# Altium footprint library Miscellaneous footprints.PcbLib: 84 footprints (part 4 of 6)
Each footprint in its own frame and in the unit in brackets; x right, y up, seen from the top. Pads: shape width x height; smd on the part's side, far side on the other; paste and mask are expansions set on the pad; w line width, h text height; cw(c..) or ccw(c..) is an arc to the next point about the centre after c.
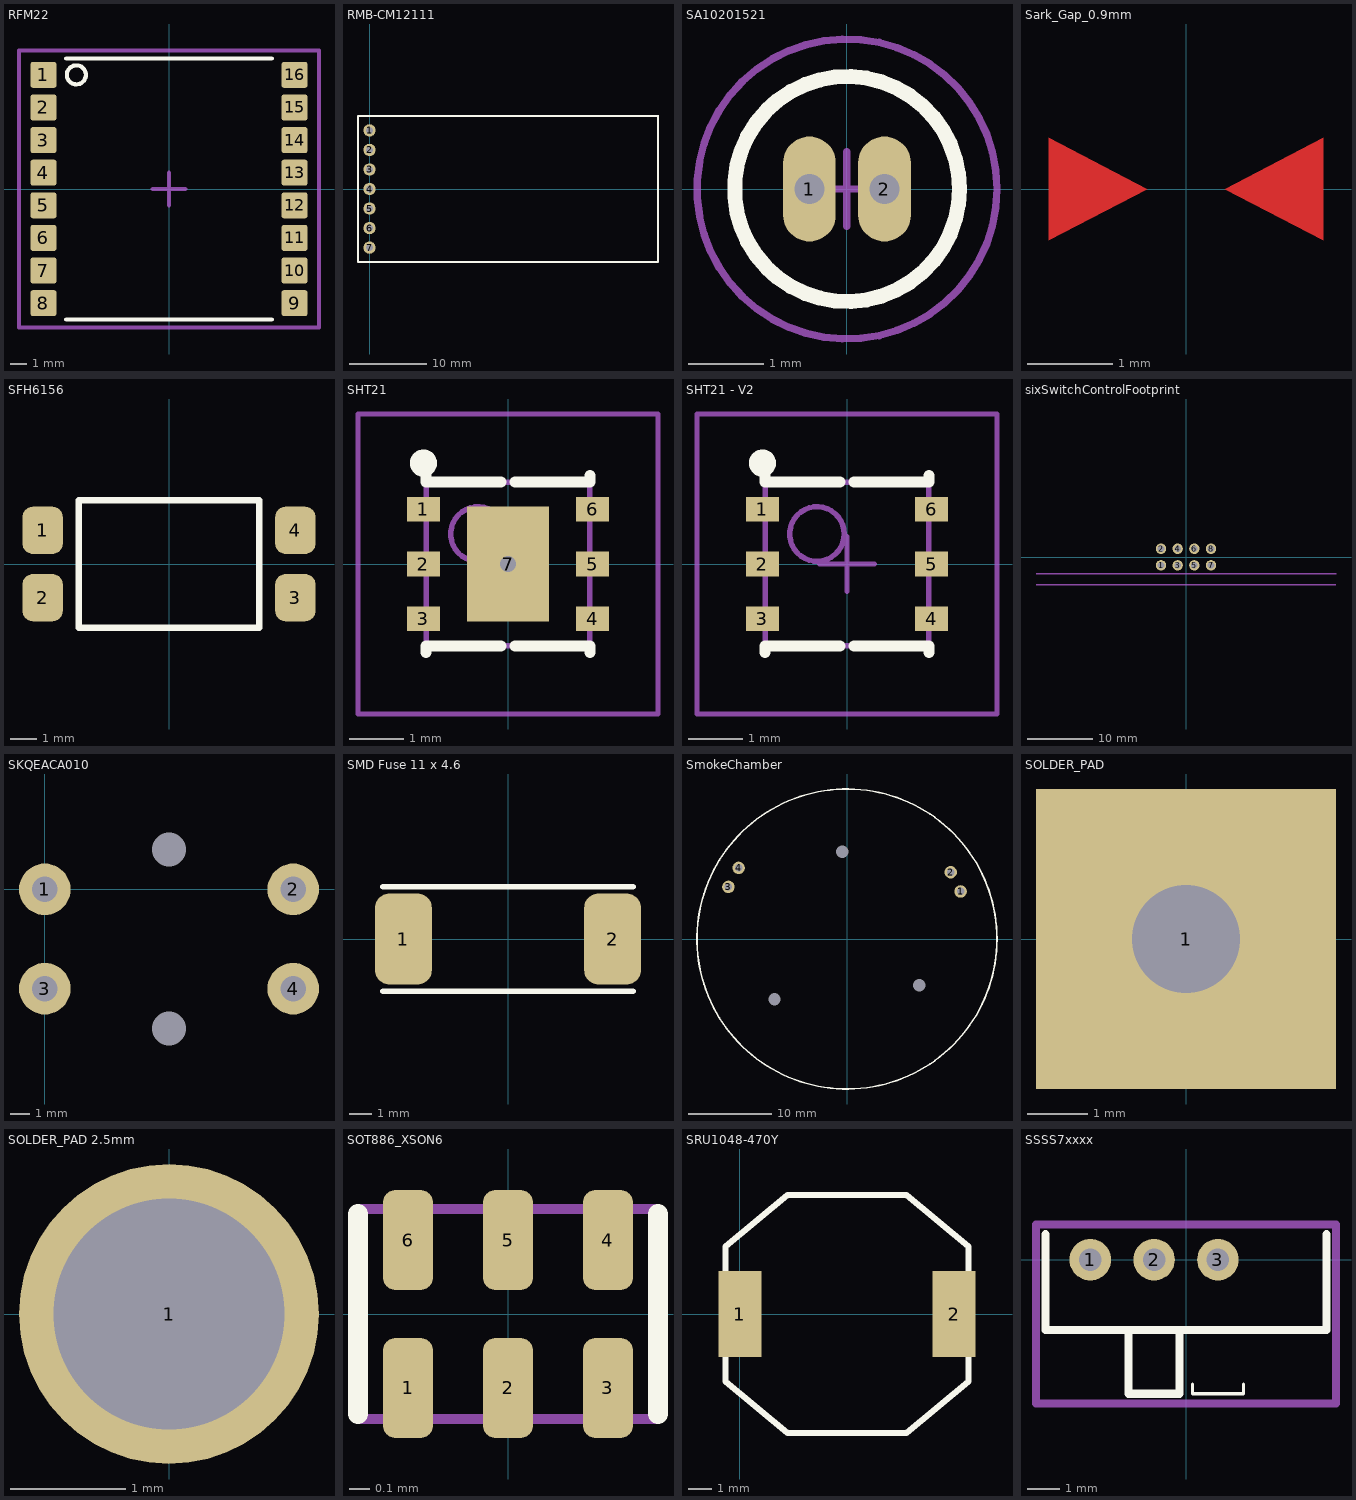
[diagram p3: the footprints below, top view; thin cyan lines are the x and y axes]

## RFM22 [mm] "RFM22"
height 1
pads (16):
  rrect20% 1.6x1.6 smd: 1(-7.7,7) 2(-7.7,5) 3(-7.7,3) 4(-7.7,1) 5(-7.7,-1) 6(-7.7,-3) 7(-7.7,-5) 8(-7.7,-7) 9(7.7,-7) 10(7.7,-5) 11(7.7,-3) 12(7.7,-1) 13(7.7,1) 14(7.7,3) 15(7.7,5) 16(7.7,7)
Top Overlay:
  circle w0.254: c-5.683,7 r0.583
  lines w0.254: -6.3,-8 6.3,-8 ; -6.3,8 6.3,8
Mechanical 15:
  lines w0.254: -1,0 1,0 ; 0,-1 0,1 ; -9.2,-8.5 9.2,-8.5 9.2,8.5 -9.2,8.5 -9.2,-8.5
3D body: height 1.9, standoff 0, extent -8,-8.1 8,7.9

## RMB-CM12111 [mm] "Wireless RF Transceiver 431-470MHz"
height 2.8
pads (7):
  round 1.6 hole 0.9: 1(0,7.62) 2(0,5.08) 3(0,2.54) 4(0,0) 5(0,-2.54) 6(0,-5.08) 7(0,-7.62)
Top Overlay:
  lines w0.254: 37.5,9.5 37.5,-9.5 -1.5,-9.5 -1.5,0 -1.5,9.5 37.5,9.5 ; 37.5,9.5 37.5,9.5

## SA10201521 [mm]
height 6
pads (2):
  oval 0.7x1.4 hole 0.4: 1(-0.5,0) 2(0.5,0)
Top Overlay:
  circle w0.2: c0,0 r1.5
Mechanical 15:
  circle w0.1: c0,0 r2
  lines w0.1: -0.5,0 0.5,0 ; 0,-0.5 0,0.5
3D body: height 6, standoff 0, extent -1.488,-1.497 1.5,1.497

## Sark_Gap_0.9mm [mm] "Sark_Gap_0.7mm"
height 1
Top Layer:
  region: 0.45,0 1.6,0.6 1.6,-0.6
  region: -0.45,0 -1.6,0.6 -1.6,-0.6
Top Solder:
  rectangle: -1.75,-0.75 1.75,0.75

## SFH6156 [mm] "SFH6156"
height 4
pads (4):
  rrect50% 1.52x1.78 smd: 1(-4.765,1.27) 2(-4.765,-1.27) 3(4.765,-1.27) 4(4.765,1.27)
Top Overlay:
  lines w0.254: -3.4,-2.4 -3.4,2.4 3.4,2.4 3.4,-2.4 -3.4,-2.4

## SHT21 [mm] "SHT21"
height 1.1
pads (7):
  rect 0.6x0.45 smd: 1(-1.55,1) 2(-1.55,0) 3(-1.55,-1) 4(1.55,-1) 5(1.55,0) 6(1.55,1)
  rect 1.5x2.1 smd paste-0.8: 7(0,0)
via 0,0 diameter 0.7 hole 0.3
Top Overlay:
  circle w0.25: c-1.55,1.85 r0.125
  lines w0.2: -1.5,-1.625 -1.5,-1.5 -0.125,-1.5 ; -1.5,1.625 -1.5,1.5 -0.125,1.5 ; 0.125,-1.5 1.5,-1.5 1.5,-1.625 ; 0.125,1.5 1.5,1.5 1.5,1.625
Top Paste:
  rectangle: 0.3,-0.6 0.6,-0.2
  rectangle: -0.6,-0.6 -0.3,-0.2
  rectangle: 0.3,0.2 0.6,0.6
  rectangle: -0.6,0.2 -0.3,0.6
Mechanical 13:
  circle w0.1: c-0.55,0.55 r0.5
  lines w0.1: -1.5,-1.5 1.5,-1.5 1.5,1.5 -1.5,1.5 -1.5,-1.5
Mechanical 15:
  lines w0.1: -0.5,0 0.5,0 ; 0,-0.5 0,0.5 ; -2.75,-2.75 2.75,-2.75 2.75,2.75 -2.75,2.75 -2.75,-2.75
3D body: height 1.1, standoff 0, extent -1.53,-1.5 1.53,1.5

## SHT21 - V2 [mm] "SHT21"
height 1.1
pads (6):
  rect 0.6x0.45 smd: 1(-1.55,1) 2(-1.55,0) 3(-1.55,-1) 4(1.55,-1) 5(1.55,0) 6(1.55,1)
Top Overlay:
  circle w0.25: c-1.55,1.85 r0.125
  lines w0.2: -1.5,-1.625 -1.5,-1.5 -0.125,-1.5 ; -1.5,1.625 -1.5,1.5 -0.125,1.5 ; 0.125,-1.5 1.5,-1.5 1.5,-1.625 ; 0.125,1.5 1.5,1.5 1.5,1.625
Mechanical 13:
  circle w0.1: c-0.55,0.55 r0.5
  lines w0.1: -1.5,-1.5 -1.5,1.5 1.5,1.5 1.5,-1.5 -1.5,-1.5
Mechanical 15:
  lines w0.1: -0.5,0 0.5,0 ; 0,-0.5 0,0.5 ; -2.75,-2.75 -2.75,2.75 2.75,2.75 2.75,-2.75 -2.75,-2.75
3D body: height 1.1, standoff 0, extent -1.53,-1.5 1.53,1.5

## sixSwitchControlFootprint [mm] "sixSwitchControl Footprint"
pads (8):
  round 1.6 hole 1: 1(-3.81,-1.27) 2(-3.81,1.27) 3(-1.27,-1.27) 4(-1.27,1.27) 5(1.27,-1.27) 6(1.27,1.27) 7(3.81,-1.27) 8(3.81,1.27)
Mechanical 13:
  lines w0.2: -22.86,-2.54 22.86,-2.54 ; -22.85,-4.2 22.85,-4.2
  text "PCB" at -21.45,-3.85 h1
3D body: height 53.73, standoff -4, extent -23.75,-6.45 23.75,7.15

## SKQEACA010 [mm] "SKQEACA010"
pads (6):
  round 0 hole 1.7: 0(6.25,-7) 0(6.25,2)
  round 2.6 hole 1.3: 1(0,0) 2(12.5,0) 3(0,-5) 4(12.5,-5)

## SMD Fuse 11 x 4.6 [mm] "SMD Fuse 11 x 4.6"
height 2.55
pads (2):
  rrect50% 2.5x4 smd: 1(-4.6,0) 2(4.6,0)
Top Overlay:
  lines w0.254: -5.5,-2.3 5.5,-2.3 ; -5.5,2.3 5.5,2.3
3D body: height 3.9, standoff 0, extent -5.5,-2.3 5.5,2.3

## SmokeChamber [mm] "From Shenzhen Jikaida"
pads (7):
  round 0 hole 1.5 unplated: 0(-8.71,-7.225) 0(-0.57,10.485) 0(8.7,-5.545)
  round 1.5 hole 0.9: 1(13.65,5.71) 2(12.46,8.02) 3(-14.25,6.26) 4(-13.01,8.54)
Top Overlay:
  circle w0.2: c0,0 r18.02
3D body: height 14, standoff 0, extent -18,-17.995 18,17.995

## SOLDER_PAD [mm] "solder pad for phase input"
pads (1):
  rect 5x5 hole 1.8: 1(0,0)

## SOLDER_PAD 2.5mm [mm] "Solder pad for  2.5mm wire"
pads (1):
  round 2.6 hole 2: 1(0,0)

## SOT886_XSON6 [mm] "SOT886_XSON6"
height 0.5
pads (6):
  rrect50% 0.25x0.5 smd: 1(-0.5,-0.37) 2(0,-0.37) 3(0.5,-0.37) 4(0.5,0.37) 5(0,0.37) 6(-0.5,0.37)
Top Overlay:
  lines w0.1: -0.75,-0.5 -0.75,0.5 ; 0.75,-0.5 0.75,0.5
Mechanical 15:
  lines w0.05: -0.75,-0.525 -0.75,0.525 0.75,0.525 0.75,-0.525 -0.75,-0.525
3D body: height 0.46, standoff -0.04, extent -0.75,-0.52 0.75,0.53

## SRU1048-470Y [mm]
pads (2):
  rect 1.8x3.6 smd: 1(0,0) 2(9,0)
Top Overlay:
  lines w0.254: 4.5,5 4.6,5 ; -0.6,-2.833 2,-5 7,-5 9.6,-2.833 9.6,-1.6 9.6,2.833 7,5 2,5 -0.6,2.833 -0.6,-2.833
3D body: height 4.8, standoff 0, extent -0.601,-5.001 9.601,5.001

## SSSS7xxxx [mm] "SSSS7xxxx"
height 2.1
pads (3):
  round 1.3 hole 0.7: 1(-3,0) 2(-1,0) 3(1,0)
Top Overlay:
  lines w0.1: 0.2,-3.9 0.2,-4.2 1.8,-4.2 1.8,-3.9
  lines w0.254: -4.4,0.8 -4.4,-2.2 4.4,-2.2 4.4,0.8 ; -1.8,-2.2 -1.8,-4.2 -0.2,-4.2 -0.2,-2.2
Mechanical 13:
  lines w0.254: -4.7,-4.5 4.7,-4.5 4.7,1.1 -4.7,1.1 -4.7,-4.5
3D body: height 2, standoff -2, extent -4.4,-4.2 4.4,0.8